# Altium footprint library PVV.PcbLib: 88 footprints (part 4 of 6)
Each footprint in its own frame and in the unit in brackets; x right, y up, seen from the top. Pads: shape width x height; smd on the part's side, far side on the other; paste and mask are expansions set on the pad; w line width, h text height; cw(c..) or ccw(c..) is an arc to the next point about the centre after c.
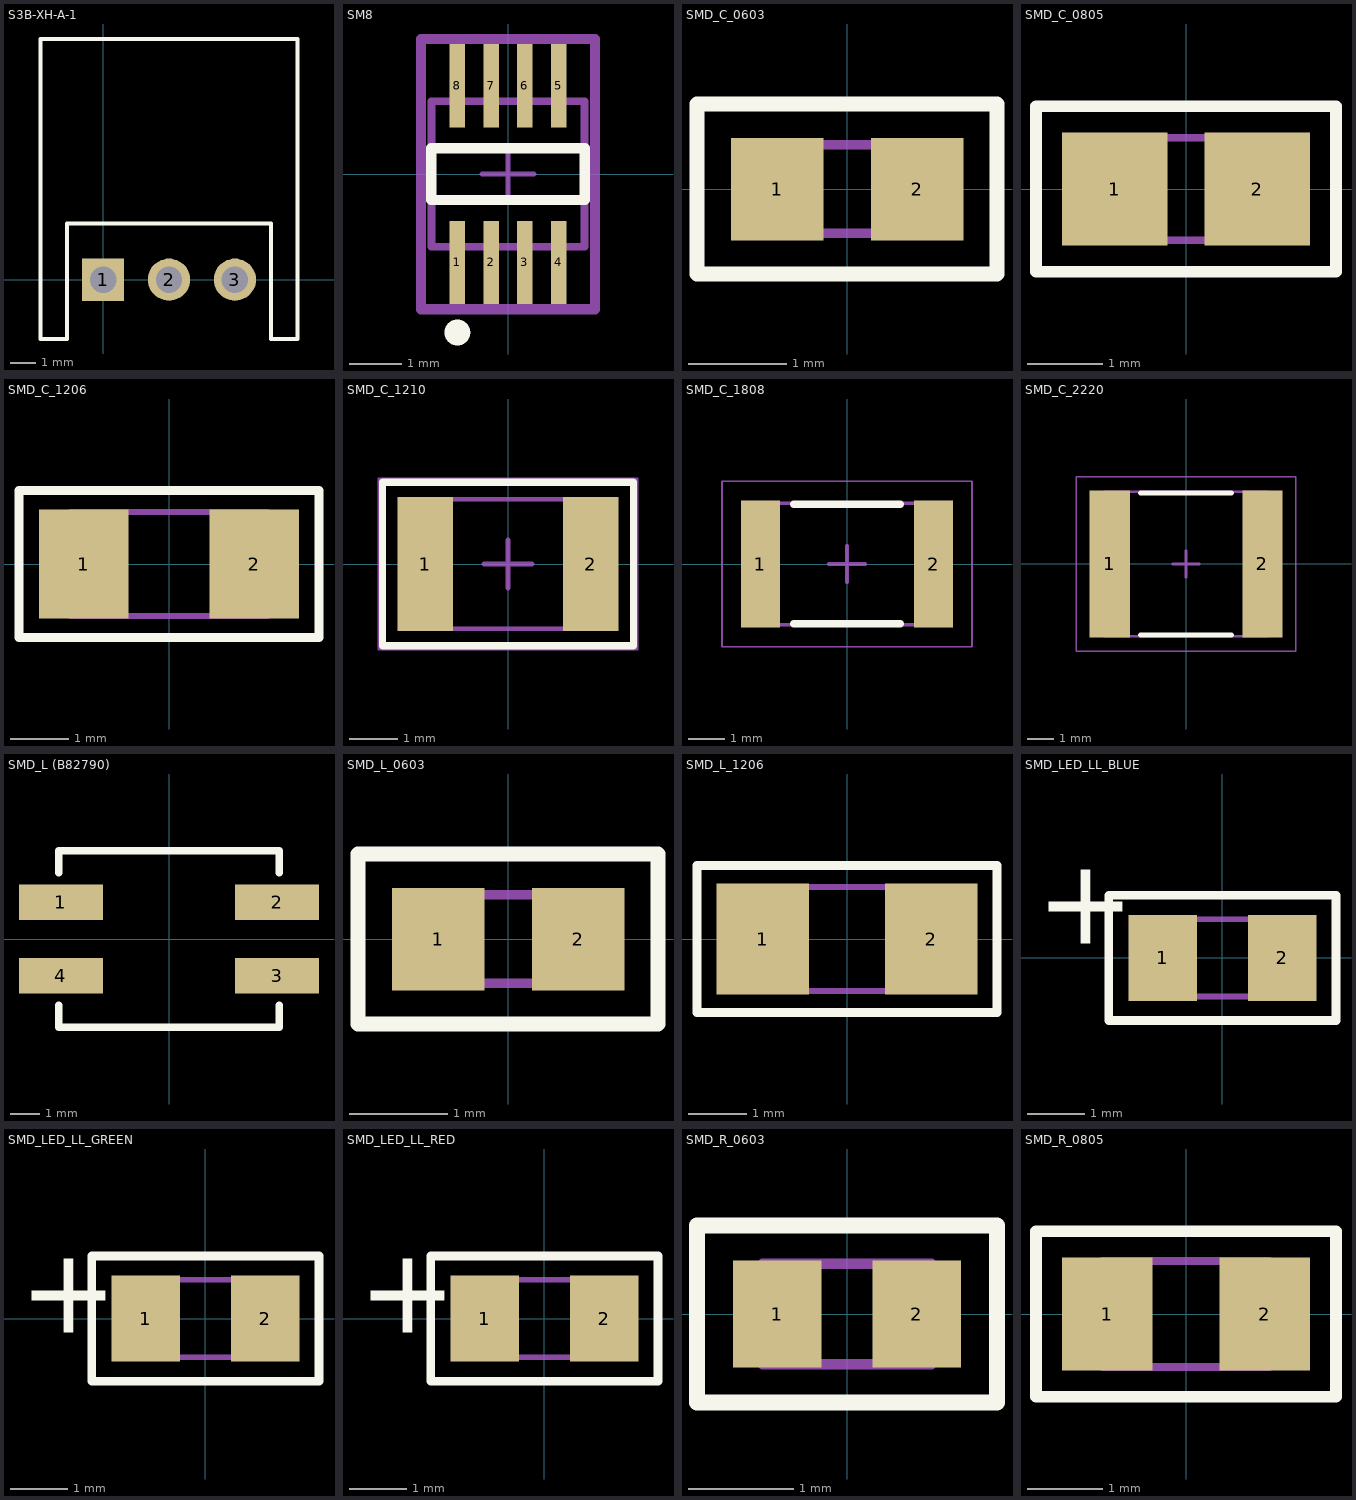
[diagram p3: the footprints below, top view; thin cyan lines are the x and y axes]

## S3B-XH-A-1 [mil]
pads (3):
  rect 64x64 / inner round 0 / far side rect 64x64 hole 40 mask+5: 1(0,0)
  round 64 / inner round 0 / far side round 64 hole 40 mask+5: 2(100,0) 3(200,0)
Top Overlay:
  lines w6: -95,-90 -95,365 295,365 295,-90 255,-90 255,85 -55,85 -55,-90 -95,-90
3D body "S3B-XH-A.STEP": height 243.13, standoff -132.86, extent -94.88,-90.38 294.88,362.38

## SM8 [mm] "Texas_Instruments_SN74LVC2G00DCTR_0"
pads (8):
  rect 0.3x1.6 smd paste-1000 mask+0: 1(-0.975,-1.7) 2(-0.325,-1.7) 3(0.325,-1.7) 4(0.975,-1.7) 5(0.975,1.7) 6(0.325,1.7) 7(-0.325,1.7) 8(-0.975,1.7)
Top Overlay:
  circle w0.25: c-0.975,-3.05 r0.125
  lines w0.2: -1.475,-0.5 1.475,-0.5 1.475,0.5 -1.475,0.5 -1.475,-0.5
Top Paste:
  rectangle: -1.1,-2.475 -0.85,-0.925
  rectangle: 0.85,-2.475 1.1,-0.925
  rectangle: 0.85,0.925 1.1,2.475
  rectangle: -1.1,0.925 -0.85,2.475
  rectangle: -0.45,0.925 -0.2,2.475
  rectangle: 0.2,0.925 0.45,2.475
  rectangle: 0.2,-2.475 0.45,-0.925
  rectangle: -0.45,-2.475 -0.2,-0.925
Mechanical 10:
  lines w0.2: -1.675,-2.6 1.675,-2.6 1.675,2.6 -1.675,2.6 -1.675,-2.6
  text ".Designator" at 0,0 h1
Mechanical 12:
  lines w0.15: -1.475,-1.4 1.475,-1.4 1.475,1.4 -1.475,1.4 -1.475,-1.4
Mechanical 15:
  lines w0.1: -0.503,0 0.503,0 ; 0,-0.503 0,0.503
  lines w0.2: -1.675,-2.6 1.675,-2.6 1.675,2.6 -1.675,2.6 -1.675,-2.6
3D body "3dmodel.step": height 0.25, standoff 0, extent -1.675,-2.6 1.675,2.6

## SMD_C_0603 [mil] "Chip Capacitor, 2-Leads, Body 1,60x0,80mm, IPC Low Density"
height 31.5
pads (2):
  rect 37x41 smd: 1(-28,0) 2(28,0)
Top Overlay:
  lines w6: -60,-34 -60,34 60,34 60,-34 -60,-34
Mechanical 13:
  lines w3.94: -33.46,-17.72 33.46,-17.72 33.46,17.72 -33.46,17.72 -33.46,-17.72
3D body "CAPC1608X08M.step": height 31.5, standoff 0, extent -33.46,-17.72 33.46,17.72

## SMD_C_0805 [mil] "Chip Capacitor, 2-Leads, Body 2,00x1,25mm, IPC Low Density"
height 23.62
pads (2):
  rect 55x59 smd: 1(-37,0) 2(37,0)
Top Overlay:
  lines w6: -78,-43 78,-43 78,43 -78,43 -78,-43
Mechanical 13:
  lines w3.94: -41.34,-26.57 41.34,-26.57 41.34,26.57 -41.34,26.57 -41.34,-26.57
3D body "CAPC2012X06M.step": height 23.62, standoff 0, extent -41.34,-26.57 41.34,26.57

## SMD_C_1206 [mil] "Chip Capacitor, 2-Leads, Body 3,20x1,60mm, IPC Low Density"
height 62.99
pads (2):
  rect 61x74 smd: 1(-58,0) 2(58,0)
Top Overlay:
  lines w6: -102,-50 102,-50 102,50 -102,50 -102,-50
Mechanical 13:
  lines w3.94: -66.93,-35.43 -66.93,35.43 66.93,35.43 66.93,-35.43 -66.93,-35.43
3D body "CAPC3216X16M.step": height 62.99, standoff 0, extent -66.93,-35.43 66.93,35.43

## SMD_C_1210 [mm] "Chip Capacitor, 2-Leads, Body 3,20x2,50mm, IPC Low Density"
height 2.5
pads (2):
  rect 1.15x2.8 smd: 1(-1.725,0) 2(1.725,0)
Top Overlay:
  lines w0.152: -2.616,-1.702 2.616,-1.702 2.616,1.702 -2.616,1.702 -2.616,-1.702
Mechanical 13:
  lines w0.1: -1.75,-1.35 -1.75,1.35 1.75,1.35 1.75,-1.35 -1.75,-1.35
Mechanical 15:
  lines w0.05: -2.692,-1.778 -2.692,1.778 2.692,1.778 2.692,-1.778 -2.692,-1.778
  lines w0.1: -0.5,0 0.5,0 ; 0,-0.5 0,0.5
3D body "CAPC3225X25M.step": height 2.5, standoff 0, extent -1.75,-1.35 1.75,1.35

## SMD_C_1808 [mm] "Chip Capacitor, 2-Leads, Body 4,52x3,25mm, IPC Low Density"
height 1.5
pads (2):
  rect 1.05x3.45 smd: 1(-2.35,0) 2(2.35,0)
Top Overlay:
  lines w0.2: -1.45,-1.625 1.45,-1.625 ; -1.45,1.625 1.45,1.625
Mechanical 13:
  lines w0.1: -2.27,-1.65 -2.27,1.65 2.27,1.65 2.27,-1.65 -2.27,-1.65
Mechanical 15:
  lines w0.05: -3.4,-2.25 -3.4,2.25 3.4,2.25 3.4,-2.25 -3.4,-2.25
  lines w0.1: -0.5,0 0.5,0 ; 0,-0.5 0,0.5
3D body: height 1.5, standoff 0, extent -1.92,-1.65 1.92,1.65
3D body: height 1.5, standoff 0, extent -2.27,-1.65 -1.92,1.65
3D body: height 1.5, standoff 0, extent 1.92,-1.65 2.27,1.65

## SMD_C_2220 [mm] "Chip2PinSM127P600-8N"
height 2
pads (2):
  rect 1.5x5.5 smd: 1(-2.85,0) 2(2.85,0)
Top Overlay:
  lines w0.2: -1.7,-2.65 1.7,-2.65 ; -1.7,2.65 1.7,2.65
Mechanical 13:
  lines w0.1: -3.05,-2.7 3.05,-2.7 3.05,2.7 -3.05,2.7 -3.05,-2.7
Mechanical 15:
  lines w0.05: -4.1,-3.25 4.1,-3.25 4.1,3.25 -4.1,3.25 -4.1,-3.25
  lines w0.1: -0.5,0 0.5,0 ; 0,-0.5 0,0.5
3D body "SMD_C_2220.step": height 2, standoff 0, extent -3.05,-2.7 3.05,2.7

## SMD_L (B82790) [mm]
pads (4):
  rect 2.85x1.2 smd: 1(-3.675,1.25) 2(3.675,1.25) 3(3.675,-1.25) 4(-3.675,-1.25)
Top Overlay:
  lines w0.254: -3.75,-2.25 -3.75,-3 3.75,-3 3.75,-2.25 ; -3.75,2.25 -3.75,3 3.75,3 3.75,2.25
3D body "User Library-B82790.STEP": height 5.2, standoff 0, extent -4.492,-3 4.492,3

## SMD_L_0603 [mil] "Chip Ferrite, 2-Leads, Body 1,60x0,80mm, IPC Low Density"
height 31.5
pads (2):
  rect 37x41 smd: 1(-28,0) 2(28,0)
Top Overlay:
  lines w6: -60,-34 60,-34 60,34 -60,34 -60,-34
Mechanical 13:
  lines w3.94: -33.46,-17.72 -33.46,17.72 33.46,17.72 33.46,-17.72 -33.46,-17.72
3D body "CAPC1608X08M.step": height 31.5, standoff 0, extent -33.46,-17.72 33.46,17.72

## SMD_L_1206 [mm] "Chip Inductor, 2-Leads, Body 3,20x1,60mm, IPC Low Density"
height 1.1
pads (2):
  rect 1.59x1.92 smd: 1(-1.455,0) 2(1.455,0)
Top Overlay:
  lines w0.152: -2.591,-1.27 -2.591,1.27 2.591,1.27 2.591,-1.27 -2.591,-1.27
Mechanical 13:
  lines w0.1: -1.7,-0.9 1.7,-0.9 1.7,0.9 -1.7,0.9 -1.7,-0.9
3D body "INDC3216X11M.step": height 1.1, standoff 0, extent -1.7,-0.9 1.7,0.9

## SMD_LED_LL_BLUE [mil] "Chip Diode, 2-Leads, Body 2,00x1,25mm, IPC Low Density"
height 31.5
pads (2):
  rect 47x59 smd: 1(-41,0) 2(41,0)
Top Overlay:
  lines w6: -78,-43 -78,43 78,43 78,-43 -78,-43
  text "+" at -127.95,9.84 h59.06
Mechanical 13:
  lines w3.94: -41.34,-26.57 -41.34,26.57 41.34,26.57 41.34,-26.57 -41.34,-26.57
3D body: height 31.5, standoff 0, extent -25.59,-26.57 25.59,26.57
3D body: height 31.5, standoff 0, extent -41.34,-26.57 -25.59,26.57
3D body: height 31.5, standoff 0, extent 25.59,-26.57 41.34,26.57

## SMD_LED_LL_GREEN [mil] "Chip Diode, 2-Leads, Body 2,00x1,25mm, IPC Low Density"
height 31.5
pads (2):
  rect 47x59 smd: 1(-41,0) 2(41,0)
Top Overlay:
  lines w6: -78,-43 78,-43 78,43 -78,43 -78,-43
  text "+" at -127.95,-9.84 h59.06
Mechanical 13:
  lines w3.94: -41.34,-26.57 41.34,-26.57 41.34,26.57 -41.34,26.57 -41.34,-26.57
3D body: height 31.5, standoff 0, extent 25.59,-26.57 41.34,26.57
3D body: height 31.5, standoff 0, extent -41.34,-26.57 -25.59,26.57
3D body: height 31.5, standoff 0, extent -25.59,-26.57 25.59,26.57

## SMD_LED_LL_RED [mil] "Chip Diode, 2-Leads, Body 2,00x1,25mm, IPC Low Density"
height 31.5
pads (2):
  rect 47x59 smd: 1(-41,0) 2(41,0)
Top Overlay:
  lines w6: -78,-43 78,-43 78,43 -78,43 -78,-43
  text "+" at -127.95,-9.84 h59.06
Mechanical 13:
  lines w3.94: -41.34,-26.57 41.34,-26.57 41.34,26.57 -41.34,26.57 -41.34,-26.57
3D body: height 31.5, standoff 0, extent 25.59,-26.57 41.34,26.57
3D body: height 31.5, standoff 0, extent -41.34,-26.57 -25.59,26.57
3D body: height 31.5, standoff 0, extent -25.59,-26.57 25.59,26.57

## SMD_R_0603 [mil] "Chip Resistor, 2-Leads, Body 1,55x0,85mm, IPC Low Density"
height 17.72
pads (2):
  rect 33x40 smd: 1(-26,0) 2(26,0)
Top Overlay:
  lines w6: -56,-33 56,-33 56,33 -56,33 -56,-33
Mechanical 13:
  lines w3.94: -31.5,-18.7 31.5,-18.7 31.5,18.7 -31.5,18.7 -31.5,-18.7
3D body "RESC1608X05M.step": height 17.72, standoff 0, extent -31.5,-18.7 31.5,18.7

## SMD_R_0805 [mil] "Chip Resistor, 2-Leads, Body 2,05x1,22mm, IPC Low Density"
height 17.72
pads (2):
  rect 47x59 smd: 1(-41,0) 2(41,0)
Top Overlay:
  lines w6: -78,-43 78,-43 78,43 -78,43 -78,-43
Mechanical 13:
  lines w3.94: -43.31,-27.56 43.31,-27.56 43.31,27.56 -43.31,27.56 -43.31,-27.56
3D body "RESC2112X05M.step": height 17.72, standoff 0, extent -43.31,-27.56 43.31,27.56